# Altium footprint library PCB SOM AM625.PcbLib: 64 footprints (part 3 of 4)
Each footprint in its own frame and in the unit in brackets; x right, y up, seen from the top. Pads: shape width x height; smd on the part's side, far side on the other; paste and mask are expansions set on the pad; w line width, h text height; cw(c..) or ccw(c..) is an arc to the next point about the centre after c.
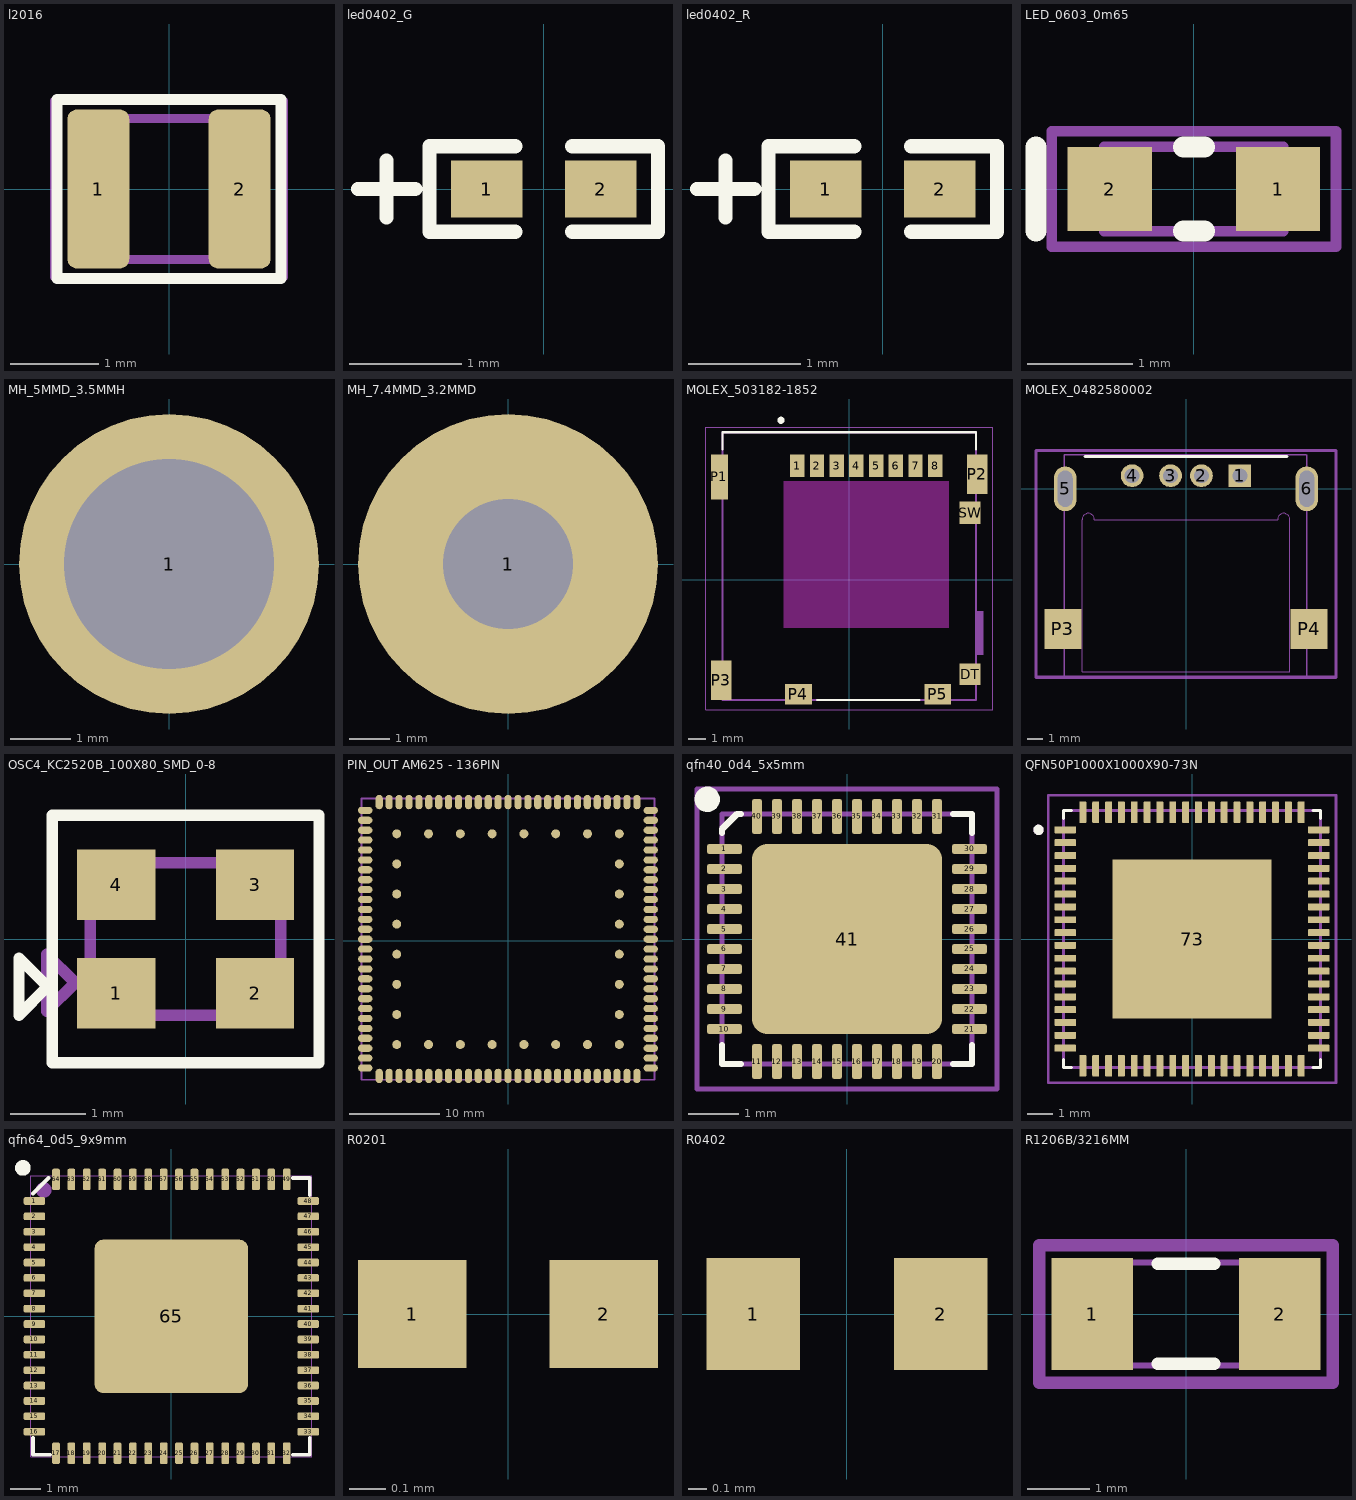
[diagram p2: the footprints below, top view; thin cyan lines are the x and y axes]

## l2016 [mil]
pads (2):
  rrect29% 27.56x70.86 smd: 1(-31.5,0) 2(31.5,0)
Top Overlay:
  lines w5: -50,-40 50,-40 50,40 -50,40 -50,-40
Top CMT:
  lines w3.94: -51.18,-39.37 -51.18,39.37 51.18,39.37 51.18,-39.37 -51.18,-39.37
  text ".Comment" at -46.6,-8.67 h23.62
Bottom CMT:
  lines w1: -50,-40 50,-40 50,40 -50,40 -50,-40
Top ASM:
  lines w3.94: -39.37,-31.5 -39.37,31.5 39.37,31.5 39.37,-31.5 -39.37,-31.5
  text "'.Designator'" at -70.22,-8.67 h23.62
3D body "User Library-CIGT2016.STEP": height 39.37, standoff 0, extent -39.37,-31.5 39.37,31.5

## led0402_G [mil]
pads (2):
  rect 25x20 smd: 1(-20,0) 2(20,0)
Top Overlay:
  lines w5: -65,0 -45,0 ; -55,-10 -55,10 ; -10,-15 -40,-15 -40,15 -10,15 ; 10,-15 40,-15 40,15 10,15
3D body "User Library-LED_1006_G.STEP": height 7.88, standoff 0, extent -19.7,-11.82 19.67,11.8

## led0402_R [mil]
pads (2):
  rect 25x20 smd: 1(-20,0) 2(20,0)
Top Overlay:
  lines w5: -65,0 -45,0 ; -55,-10 -55,10 ; -10,-15 -40,-15 -40,15 -10,15 ; 10,-15 40,-15 40,15 10,15
3D body "User Library-LED_1006_R.STEP": height 7.88, standoff 0, extent -19.69,-11.82 19.69,11.81

## LED_0603_0m65 [mm]
height 0.65
pads (2):
  rect 0.8x0.8 smd: 1(0.8,0) 2(-0.8,0)
Top Overlay:
  lines w0.2: -1.5,-0.4 -1.5,0.4 ; -0.1,-0.4 0.1,-0.4 ; -0.1,0.4 0.1,0.4
Top Assembly:
  lines w0.1: -0.85,-0.4 -0.85,0.4 0.85,0.4 0.85,-0.4 -0.85,-0.4
Top Value:
  lines w0.1: -1.35,-0.55 0.175,-0.55 1.35,-0.55 1.35,0.55 -1.35,0.55 -1.35,-0.55
3D body "LED SMD 0603.step": height 0.65, standoff 0, extent -0.85,-0.4 0.85,0.4
3D body: height 0.66, standoff 0.5, extent -0.2,-0.2 0.2,0.2

## MH_5MMD_3.5MMH [mm]
pads (1):
  round 5 hole 3.5: 1(0,0)

## MH_7.4MMD_3.2MMD [mm]
pads (1):
  round 7.4 / inner round 3.683 / far side round 7.4 hole 3.2 mask+0.025: 1(0,0)

## MOLEX_503182-1852 [mm]
pads (15):
  rect 0.8x1.24 smd: 1(-2.9,6.355) 2(-1.8,6.355) 3(-0.7,6.355) 4(0.4,6.355) 5(1.5,6.355) 6(2.6,6.355) 7(3.7,6.355) 8(4.8,6.355)
  rect 1.16x1.2 smd: DT(6.74,-5.275)
  rect 0.95x2.5 smd: P1(-7.245,5.725)
  rect 1.15x2.2 smd: P2(7.145,5.875) P3(-7.145,-5.605)
  rect 1.5x1.15 smd: P4(-2.84,-6.4) P5(4.94,-6.4)
  rect 1.16x1.25 smd: SW(6.74,3.725)
Top Overlay:
  circle w0.2: c-3.81,8.89 r0.1
  lines w0.127: -7.07,7.28 -7.07,8.225 7.07,8.225 7.07,7.28 ; -1.8,-6.725 3.9,-6.725
Keep-Out Layer:
  region: 5.55,-2.682 -3.659,-2.682 -3.659,0.725 5.55,0.725
  region: 5.55,0.726 -3.655,0.726 -3.655,5.485 5.55,5.485
  region: 5.55,0.727 -3.658,0.727 -3.658,5.485 5.55,5.485
Mechanical 13:
  lines w0.127: -7.07,-6.725 7.07,-6.725 7.07,8.225 -7.07,8.225 -7.07,-6.725
Mechanical 15:
  region: 7.47,-4.184 7.085,-4.184 7.085,-1.775 7.47,-1.775
  lines w0.05: -8,-7.25 8,-7.25 8,8.5 -8,8.5 -8,-7.25
3D body "503182-1852.step": height 1.5, standoff 0.03, extent -7.44,-6.675 7.5,8.275

## MOLEX_0482580002 [mm]
pads (8):
  rect 1.478x1.478 hole 0.97: 1(3.5,0.85)
  round 1.478 hole 0.97: 2(1,0.85) 3(-1,0.85) 4(-3.5,0.85)
  oval 1.458x2.916 hole 0.95 slot 2.35 at 90 deg: 5(-7.85,0) 6(7.85,0)
  rect 2.4x2.6 smd: P3(-8,-9.1) P4(8,-9.1)
Top Overlay:
  lines w0.2: -6.55,2.1 6.55,2.1
Mechanical 1:
  lines w0: -6.75,-11.9 -6.75,-2 cw(c-6.35,-2) -6.35,-1.6 cw(c-6.35,-2) -5.95,-2 5.95,-2 cw(c6.35,-2) 6.35,-1.6 cw(c6.35,-2) 6.75,-2 6.75,-11.9 -6.75,-11.9
Top CMT:
  lines w0.2: -9.75,-12.25 9.75,-12.25 9.75,2.5 -9.75,2.5 -9.75,-12.25
Top ASM:
  lines w0.1: -7.9,-12.25 -7.9,2.2 7.825,2.2 7.85,2.175 7.85,-12.275 -7.875,-12.275 -7.9,-12.25
3D body "0482580002.step": height 4.27, standoff -2.63, extent -8.5,-12.15 8.6,1.85

## OSC4_KC2520B_100X80_SMD_0-8 [mil] "OSC4_KC2520B_100X80_SMD_0-8"
pads (4):
  rect 41x37 smd: 1(-36.42,-28.54) 2(36.42,-28.54) 3(36.42,28.54) 4(-36.42,28.54)
Top Overlay:
  lines w6: -87.5,-40 -87.5,-10 -72.5,-25 -87.5,-40 ; -70,-65 -70,65 70,65 70,-65 -70,-65
Mechanical 49:
  text "1" at -40.42,28.54 h10
  text "3" at 32.42,-28.54 h10
  text "4" at -40.42,-28.54 h10
  text "2" at 32.42,28.54 h10
Top Assembly (Mech50):
  lines w6: -73,-38 -73,-8 -58,-23 -73,-38 ; -50,-40 -50,40 50,40 50,-40 -50,-40
3D body "User Library-oscil-KC2520K.step": height 31.5, standoff 0, extent -49.21,-39.37 49.21,39.37

## PIN_OUT AM625 - 136PIN [mm]
pads (136):
  oval 1.6x0.8 smd: 1(-15.85,-14.121) 2(-15.85,-13.021) 3(-15.85,-11.921) 4(-15.85,-10.821) 5(-15.85,-9.721) 6(-15.85,-8.621) 7(-15.85,-7.521) 8(-15.85,-6.421) 9(-15.85,-5.321) 10(-15.85,-4.221) 11(-15.85,-3.121) 12(-15.85,-2.021) 13(-15.85,-0.921) 14(-15.85,0.179) 15(-15.85,1.279) 16(-15.85,2.379) 17(-15.85,3.479) 18(-15.85,4.579) 19(-15.85,5.679) 20(-15.85,6.779) 21(-15.85,7.879) 22(-15.85,8.979) 23(-15.85,10.079) 24(-15.85,11.179) 25(-15.85,12.279) 26(-15.85,13.379) 27(-15.85,14.479) 55(15.85,14.475) 56(15.85,13.379) 57(15.85,12.279) 58(15.85,11.179) 59(15.85,10.079) 60(15.85,8.979) 61(15.85,7.879) 62(15.85,6.779) 63(15.85,5.679) 64(15.85,4.579) 65(15.85,3.479) 66(15.85,2.379) 67(15.85,1.279) 68(15.85,0.179) 69(15.85,-0.921) 70(15.85,-2.021) 71(15.85,-3.121) 72(15.85,-4.221) 73(15.85,-5.321) 74(15.85,-6.421) 75(15.85,-7.521) 76(15.85,-8.621) 77(15.85,-9.721) 78(15.85,-10.821) 79(15.85,-11.921) 80(15.85,-13.021) 81(15.85,-14.121)
  oval 0.8x1.6 smd: 28(-14.294,15.4) 29(-13.194,15.4) 30(-12.094,15.4) 31(-10.994,15.4) 32(-9.894,15.4) 33(-8.794,15.4) 34(-7.694,15.4) 35(-6.594,15.4) 36(-5.494,15.4) 37(-4.394,15.4) 38(-3.294,15.4) 39(-2.194,15.4) 40(-1.094,15.4) 41(0.006,15.4) 42(1.106,15.4) 43(2.206,15.4) 44(3.306,15.4) 45(4.406,15.4) 46(5.506,15.4) 47(6.606,15.4) 48(7.706,15.4) 49(8.806,15.4) 50(9.906,15.4) 51(11.006,15.4) 52(12.106,15.4) 53(13.206,15.4) 54(14.306,15.4) 82(14.306,-15) 83(13.206,-15) 84(12.106,-15) 85(11.006,-15) 86(9.906,-15) 87(8.806,-15) 88(7.706,-15) 89(6.606,-15) 90(5.506,-15) 91(4.406,-15) 92(3.306,-15) 93(2.206,-15) 94(1.106,-15) 95(0.006,-15) 96(-1.094,-15) 97(-2.194,-15) 98(-3.294,-15) 99(-4.394,-15) 100(-5.494,-15) 101(-6.594,-15) 102(-7.694,-15) 103(-8.794,-15) 104(-9.894,-15) 105(-10.994,-15) 106(-12.094,-15) 107(-13.194,-15) 108(-14.294,-15)
  round 1 smd: 109(-12.35,11.879) 110(-8.821,11.879) 111(-5.292,11.879) 112(-1.763,11.879) 113(1.766,11.879) 114(5.295,11.879) 115(8.824,11.879) 116(12.353,11.879) 117(12.353,8.537) 118(12.353,5.195) 119(12.353,1.853) 120(12.353,-1.489) 121(12.353,-4.831) 122(12.353,-8.173) 123(12.353,-11.515) 124(8.824,-11.515) 125(5.295,-11.515) 126(1.766,-11.515) 127(-1.763,-11.515) 128(-5.292,-11.515) 129(-8.821,-11.515) 130(-12.35,-11.515) 131(-12.35,-8.173) 132(-12.35,-4.831) 133(-12.35,-1.489) 134(-12.35,1.853) 135(-12.35,5.195) 136(-12.35,8.537)
Top ASM:
  lines w0.2: -16.25,-15.421 -16.25,15.779 16.25,15.779 16.25,-15.421 -16.25,-15.421
3D body "PCB MODULE AM625.step": height 3.6, standoff -0.3, extent -16.25,-15.45 16.25,15.75

## qfn40_0d4_5x5mm [mm]
pads (41):
  rrect50% 0.7x0.2 smd: 1(-2.45,1.8) 2(-2.45,1.4) 3(-2.45,1) 4(-2.45,0.6) 5(-2.45,0.2) 6(-2.45,-0.2) 7(-2.45,-0.6) 8(-2.45,-1) 9(-2.45,-1.4) 10(-2.45,-1.8) 21(2.45,-1.8) 22(2.45,-1.4) 23(2.45,-1) 24(2.45,-0.6) 25(2.45,-0.2) 26(2.45,0.2) 27(2.45,0.6) 28(2.45,1) 29(2.45,1.4) 30(2.45,1.8)
  rrect50% 0.2x0.7 smd: 11(-1.8,-2.45) 12(-1.4,-2.45) 13(-1,-2.45) 14(-0.6,-2.45) 15(-0.2,-2.45) 16(0.2,-2.45) 17(0.6,-2.45) 18(1,-2.45) 19(1.4,-2.45) 20(1.8,-2.45) 31(1.8,2.45) 32(1.4,2.45) 33(1,2.45) 34(0.6,2.45) 35(0.2,2.45) 36(-0.2,2.45) 37(-0.6,2.45) 38(-1,2.45) 39(-1.4,2.45) 40(-1.8,2.45)
  rrect16% 3.8x3.8 smd: 41(0,0)
Top Overlay:
  circle w0.254: c-2.794,2.794 r0.127
  lines w0.127: -2.5,-2.124 -2.5,-2.5 -2.124,-2.5 ; -2.5,2.124 -2.5,2.2 -2.2,2.5 -2.124,2.5 ; 2.124,-2.5 2.5,-2.5 2.5,-2.124 ; 2.124,2.5 2.5,2.5 2.5,2.124
Top CMT:
  lines w0.1: -3,-3 -3,2.8 -3,3 3,3 3,-3 -3,-3
  text ".Comment" at -2.243,-0.38 h0.6
Top ASM:
  lines w0.1: -2.5,-2.5 -2.5,2.5 2.5,2.5 2.5,-2.5 -2.5,-2.5
  text "'.Designator'" at -2.843,-0.38 h0.6
3D body "QFN40_500_500_090_360P040.step": height 0.9, standoff 0, extent -2.505,-2.505 2.505,2.505

## QFN50P1000X1000X90-73N [mm]
pads (73):
  rrect25% 0.84x0.27 smd: 1(-4.935,4.25) 2(-4.935,3.75) 3(-4.935,3.25) 4(-4.935,2.75) 5(-4.935,2.25) 6(-4.935,1.75) 7(-4.935,1.25) 8(-4.935,0.75) 9(-4.935,0.25) 10(-4.935,-0.25) 11(-4.935,-0.75) 12(-4.935,-1.25) 13(-4.935,-1.75) 14(-4.935,-2.25) 15(-4.935,-2.75) 16(-4.935,-3.25) 17(-4.935,-3.75) 18(-4.935,-4.25) 37(4.935,-4.25) 38(4.935,-3.75) 39(4.935,-3.25) 40(4.935,-2.75) 41(4.935,-2.25) 42(4.935,-1.75) 43(4.935,-1.25) 44(4.935,-0.75) 45(4.935,-0.25) 46(4.935,0.25) 47(4.935,0.75) 48(4.935,1.25) 49(4.935,1.75) 50(4.935,2.25) 51(4.935,2.75) 52(4.935,3.25) 53(4.935,3.75) 54(4.935,4.25)
  rrect25% 0.27x0.84 smd: 19(-4.25,-4.935) 20(-3.75,-4.935) 21(-3.25,-4.935) 22(-2.75,-4.935) 23(-2.25,-4.935) 24(-1.75,-4.935) 25(-1.25,-4.935) 26(-0.75,-4.935) 27(-0.25,-4.935) 28(0.25,-4.935) 29(0.75,-4.935) 30(1.25,-4.935) 31(1.75,-4.935) 32(2.25,-4.935) 33(2.75,-4.935) 34(3.25,-4.935) 35(3.75,-4.935) 36(4.25,-4.935) 55(4.25,4.935) 56(3.75,4.935) 57(3.25,4.935) 58(2.75,4.935) 59(2.25,4.935) 60(1.75,4.935) 61(1.25,4.935) 62(0.75,4.935) 63(0.25,4.935) 64(-0.25,4.935) 65(-0.75,4.935) 66(-1.25,4.935) 67(-1.75,4.935) 68(-2.25,4.935) 69(-2.75,4.935) 70(-3.25,4.935) 71(-3.75,4.935) 72(-4.25,4.935)
  rect 6.2x6.2 smd paste-4: 73(0,0)
Top Overlay:
  circle w0.2: c-5.975,4.25 r0.1
  lines w0.127: -5,-4.705 -5,-5 -4.705,-5 ; -5,4.705 -5,5 -4.705,5 ; 4.705,-5 5,-5 5,-4.705 ; 4.705,5 5,5 5,4.705
Top Paste:
  region: 2.725,-2.725 1.425,-2.725 1.425,-1.425 2.725,-1.425
  region: 0.655,-2.725 -0.645,-2.725 -0.645,-1.425 0.655,-1.425
  region: -1.415,-2.725 -2.715,-2.725 -2.715,-1.425 -1.415,-1.425
  region: 2.725,-0.655 1.425,-0.655 1.425,0.645 2.725,0.645
  region: 0.655,-0.655 -0.645,-0.655 -0.645,0.645 0.655,0.645
  region: -1.415,-0.655 -2.715,-0.655 -2.715,0.645 -1.415,0.645
  region: 2.725,1.415 1.425,1.415 1.425,2.715 2.725,2.715
  region: 0.655,1.415 -0.645,1.415 -0.645,2.715 0.655,2.715
  region: -1.415,1.415 -2.715,1.415 -2.715,2.715 -1.415,2.715
Top CMT:
  lines w0.1: -5.605,-5.605 -5.605,5.605 5.605,5.605 5.605,-5.605 -5.605,-5.605
Top ASM:
  circle w0.2: c-5.975,4.25 r0.1
  lines w0.127: -5,-5 -5,5 5,5 5,-5 -5,-5
3D body "User Library-VQFN72_TI_RMP.step": height 0.85, standoff -0.05, extent -5,-5 5,5

## qfn64_0d5_9x9mm [mm]
pads (65):
  rrect40% 0.7x0.25 smd: 1(-4.45,3.75) 2(-4.45,3.25) 3(-4.45,2.75) 4(-4.45,2.25) 5(-4.45,1.75) 6(-4.45,1.25) 7(-4.45,0.75) 8(-4.45,0.25) 9(-4.45,-0.25) 10(-4.45,-0.75) 11(-4.45,-1.25) 12(-4.45,-1.75) 13(-4.45,-2.25) 14(-4.45,-2.75) 15(-4.45,-3.25) 16(-4.45,-3.75) 33(4.45,-3.75) 34(4.45,-3.25) 35(4.45,-2.75) 36(4.45,-2.25) 37(4.45,-1.75) 38(4.45,-1.25) 39(4.45,-0.75) 40(4.45,-0.25) 41(4.45,0.25) 42(4.45,0.75) 43(4.45,1.25) 44(4.45,1.75) 45(4.45,2.25) 46(4.45,2.75) 47(4.45,3.25) 48(4.45,3.75)
  rrect40% 0.25x0.7 smd: 17(-3.75,-4.45) 18(-3.25,-4.45) 19(-2.75,-4.45) 20(-2.25,-4.45) 21(-1.75,-4.45) 22(-1.25,-4.45) 23(-0.75,-4.45) 24(-0.25,-4.45) 25(0.25,-4.45) 26(0.75,-4.45) 27(1.25,-4.45) 28(1.75,-4.45) 29(2.25,-4.45) 30(2.75,-4.45) 31(3.25,-4.45) 32(3.75,-4.45) 49(3.75,4.45) 50(3.25,4.45) 51(2.75,4.45) 52(2.25,4.45) 53(1.75,4.45) 54(1.25,4.45) 55(0.75,4.45) 56(0.25,4.45) 57(-0.25,4.45) 58(-0.75,4.45) 59(-1.25,4.45) 60(-1.75,4.45) 61(-2.25,4.45) 62(-2.75,4.45) 63(-3.25,4.45) 64(-3.75,4.45)
  rrect12% 5x5 smd: 65(0,0)
Top Overlay:
  circle w0.254: c-4.826,4.826 r0.127
  lines w0.127: -4.5,-3.95 -4.5,-4.5 -3.95,-4.5 ; -4.5,4 -4,4.5 ; 3.95,-4.5 4.5,-4.5 4.5,-3.95 ; 3.95,4.5 4.5,4.5 4.5,3.95
Mechanical 17:
  lines w0.025: -0.635,0 0.635,0 ; 0,-0.635 0,0.635
Bottom CMT:
  circle w0.254: c-4.15,4.11 r0.127
  lines w0.025: -4.572,-4.572 -4.572,4.572 4.572,4.572 4.572,-4.572 -4.572,-4.572
  text "U?" at -0.635,0.762 h0.64
  text "U?" at 0.508,0.762 h0.64

## R0201 [mm] "Creator MM"
pads (2):
  rect 0.3x0.3 smd mask+0.04: 1(-0.265,0) 2(0.265,0)
Top ASM:
  text ".Designator" at -2.331,-0.25 h1
3D body "R0201.step": height 0.32, standoff -0.01, extent -0.3,-0.15 0.3,0.15

## R0402 [mm]
pads (2):
  rect 0.5x0.6 smd: 1(-0.5,0) 2(0.5,0)
Top ASM:
  text ".Designator" at -2.29,-0.21 h1
3D body "R0402.step": height 0.4, standoff 0, extent -0.5,-0.25 0.5,0.25

## R1206B/3216MM [mm] "Chip Resistor, 2-Leads, Body 3.2x1.6mm, IPC Medium Density"
height 0.71
pads (2):
  rect 1.3x1.8 smd: 1(-1.5,0) 2(1.5,0)
Top Overlay:
  lines w0.2: -0.45,-0.8 0.45,-0.8 ; -0.45,0.8 0.45,0.8
Top CMT:
  lines w0.2: -2.35,-1.1 -2.35,1.1 2.35,1.1 2.35,-1.1 -2.35,-1.1
  text ".Comment" at -1.155,-0.26 h0.6
Top ASM:
  lines w0.1: -1.675,-0.825 1.675,-0.825 1.675,0.825 -1.675,0.825 -1.675,-0.825
  text "'.Designator'" at -1.512,-0.306 h0.6
3D body "RC1206_3216MM.STEP": height 0.6, standoff 0, extent -1.6,-0.8 1.6,0.8